# Altium footprint library std-th.PcbLib: 171 footprints (part 5 of 11)
Each footprint in its own frame and in the unit in brackets; x right, y up, seen from the top. Pads: shape width x height; smd on the part's side, far side on the other; paste and mask are expansions set on the pad; w line width, h text height; cw(c..) or ccw(c..) is an arc to the next point about the centre after c.
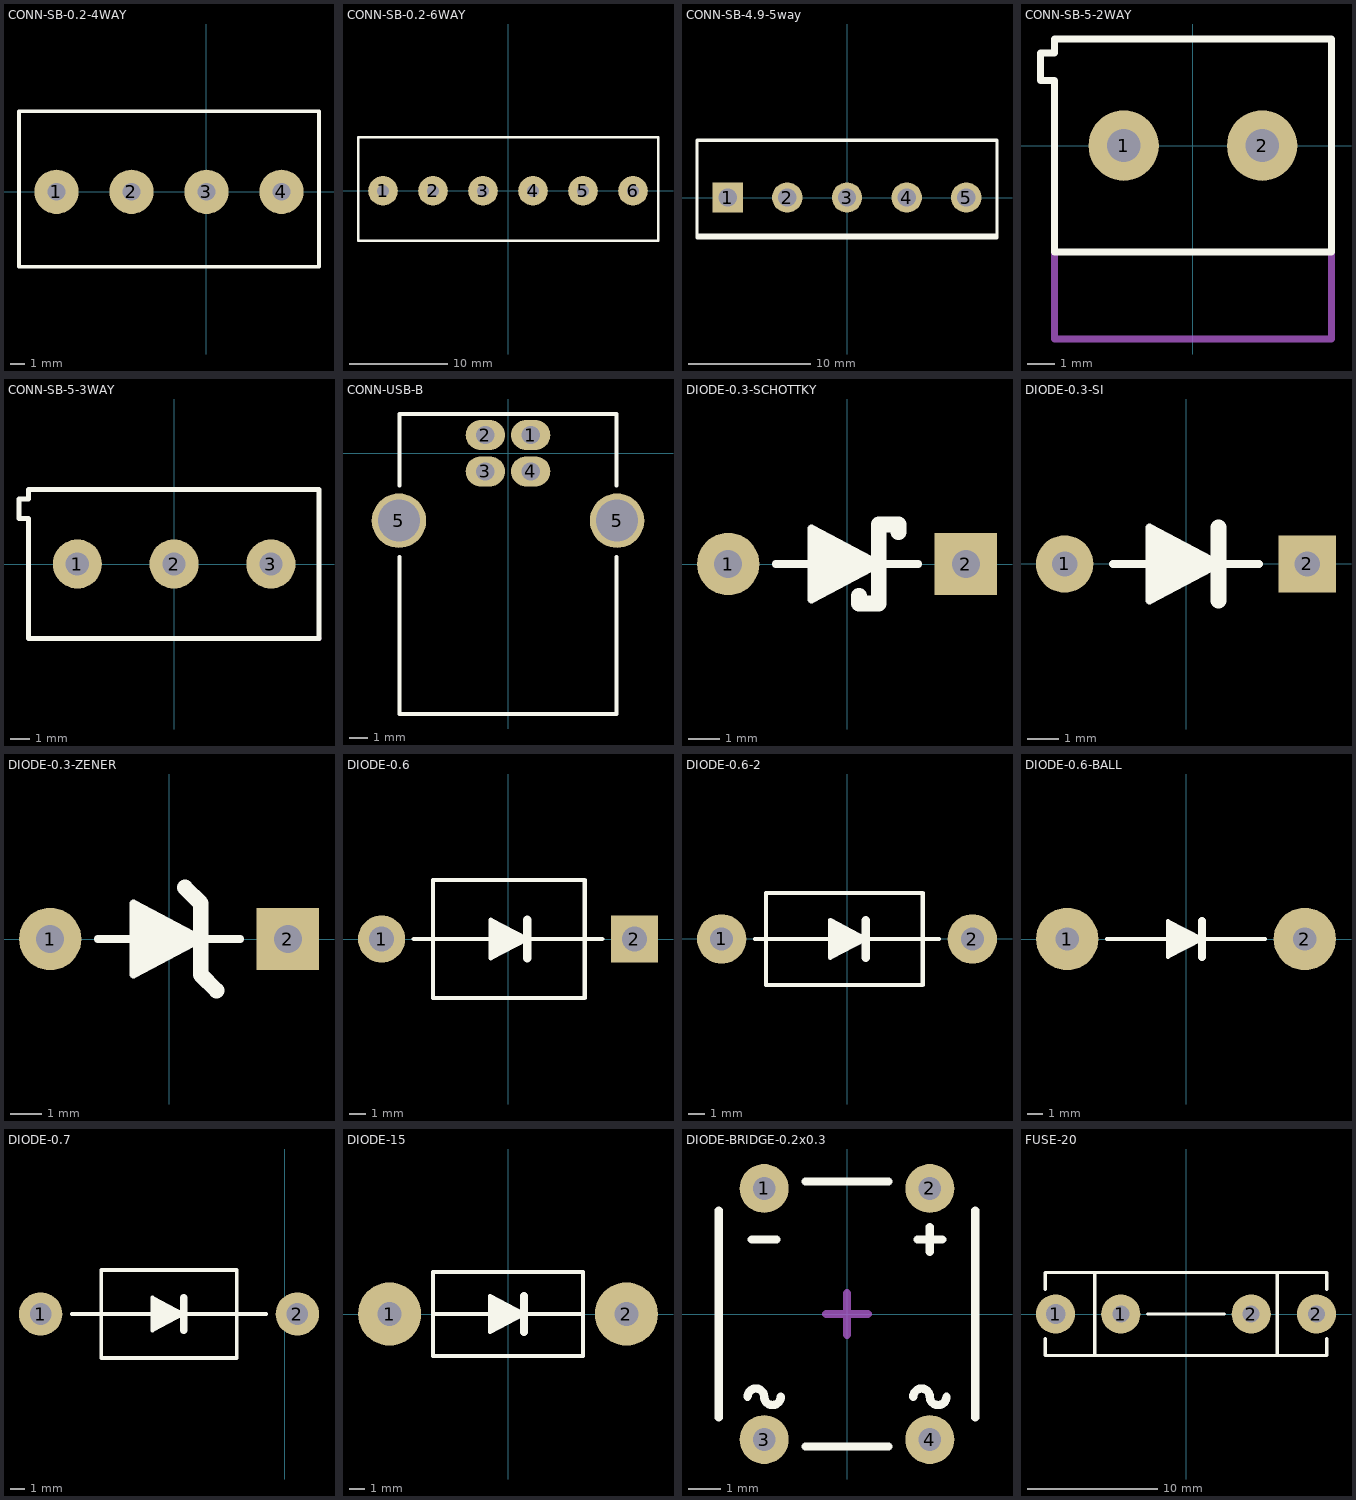
[diagram p4: the footprints below, top view; thin cyan lines are the x and y axes]

## CONN-SB-0.2-4WAY [mm] "Screw Terminal Block, 1 row 4 way, 5.08 mm pitch"
height 10
pads (4):
  round 3 hole 1.2: 1(-10.16,0) 2(-5.08,0) 3(0,0) 4(5.08,0)
Top Overlay:
  lines w0.254: -12.7,-5.08 -12.7,5.461 7.62,5.461 7.62,-5.08 -12.7,-5.08
3D body "User Library-klema-5mm-2pin.step": height 14, standoff -4, extent -12.667,-5.039 -2.667,5.461
3D body "User Library-klema-5mm-2pin.step": height 14, standoff -4, extent -2.507,-5.039 7.493,5.461

## CONN-SB-0.2-6WAY [mm] "Screw Terminal Block, 1 row 6 way, 5.08 mm pitch"
height 10
pads (6):
  round 3 hole 1.2: 1(-12.7,0) 2(-7.62,0) 3(-2.54,0) 4(2.54,0) 5(7.62,0) 6(12.7,0)
Top Overlay:
  lines w0.254: -15.24,-5.08 -15.24,5.461 15.24,5.461 15.24,-5.08 -15.24,-5.08
3D body "User Library-klema-5mm-3pin.step": height 14, standoff -4, extent -15.095,-5.026 -0.095,5.474
3D body "User Library-klema-5mm-3pin.step": height 14, standoff -4, extent 0.145,-5.026 15.145,5.474

## CONN-SB-4.9-5way [mm] "Screw block, 5 way, 4.90 mm pitch"
height 10
pads (5):
  rect 2.5x2.5 hole 1.5: 1(-9.8,0)
  round 2.5 hole 1.5: 2(-4.9,0) 3(0,0) 4(4.9,0) 5(9.8,0)
Top Overlay:
  lines w0.203: -12.319,-3.048 12.319,-3.048
  lines w0.254: -12.319,-3.302 -12.319,4.699 12.319,4.699 12.319,-3.302 -12.319,-3.302
3D body "HDR2-x.step": height 10, standoff -3.5, extent -12.366,-3.301 -2.366,4.699
3D body "HDR2-x.step": height 10, standoff -3.5, extent -7.54,-3.301 2.46,4.699
3D body "HDR2-x.step": height 10, standoff -3.5, extent 2.366,-3.301 12.366,4.699

## CONN-SB-5-2WAY [mm] "Screw Terminal Block, 1 row 2 way, 5 mm pitch"
height 10
pads (2):
  round 2.54 hole 1.2: 1(-2.5,0) 2(2.5,0)
Top Overlay:
  lines w0.254: 5,-3.85 5,3.85 -5,3.85 -5,3.35 -5.5,3.35 -5.5,2.35 -5,2.35 -5,-3.85 ; 5,-3.85 -5,-3.85 ; -5,-3.85 -5,-3.85
Mechanical 1:
  lines w0.254: -5,-3.85 -5,-6.985 ; -5,-6.985 5,-6.985 ; -5,-6.985 -5,-6.985 ; 5,-6.985 5,-3.81 ; 5,-6.985 5,-6.985 ; 5,-3.81 5,-3.81
3D body "User Library-CN_BT_1X2.step": height 10, standoff -2.28, extent -5.5,-3.85 5,3.85

## CONN-SB-5-3WAY [mm] "Screw Terminal Block, 1 row 3 way, 5 mm pitch"
height 10
pads (3):
  round 2.54 hole 1.2: 1(-5,0) 2(0,0) 3(5,0)
Top Overlay:
  lines w0.254: -8.014,2.35 -7.514,2.35 -7.514,-3.85 7.486,-3.85 7.486,-3.85 7.486,3.85 7.486,3.85 -7.514,3.85 -7.514,3.35 -8.014,3.35 -8.014,2.35
Mechanical 1:
  lines w0.254: 7.486,-3.85 7.486,-3.85
3D body "User Library-CN_BT_1X3.step": height 10.05, standoff -2.24, extent -8.014,-3.85 7.486,3.85

## CONN-USB-B [mm] "USB Connector, B Termination, Horizontal"
height 10
pads (6):
  oval 2.159x1.651 hole 1: 1(1.25,1) 2(-1.25,1) 3(-1.25,-1) 4(1.25,-1)
  round 3 hole 2.3: 5(-6,-3.71) 5(6,-3.71)
Top Overlay:
  lines w0.203: -5.969,-5.715 -5.969,-14.351 5.969,-14.351 5.969,-5.715 ; -5.969,-1.778 -5.969,2.159 5.969,2.159 5.969,-1.778
3D body "User Library-Samtec - USB-B-S-X-W-TH.STEP": height 11, standoff -3.64, extent -7.399,-14.026 7.397,2.474

## DIODE-0.3-SCHOTTKY [mm] "Axial Schottky Diode, Leads 0.3 inch spacing"
height 2.8
pads (2):
  round 2 hole 0.9: 1(-3.81,0)
  rect 2x2 hole 0.9: 2(3.81,0)
Top Overlay:
  region: -1.143,1.143 1.016,0 -1.143,-1.143
  lines w0.254: -2.286,0 2.286,0 ; -1.143,-1.143 -1.143,1.143 1.016,0 -1.143,-1.143
  lines w0.508: 0.381,-1.016 0.381,-1.27 1.016,-1.27 1.016,1.27 1.651,1.27 1.651,1.016
3D body "1N4007.step": height 3.06, standoff -1.27, extent -4.204,-1.333 4.204,1.334

## DIODE-0.3-SI [mm] "Axial Silicon Diode, Leads 0.3 inch spacing"
height 2.8
pads (2):
  round 1.8 hole 0.8: 1(-3.81,0)
  rect 1.8x1.8 hole 0.8: 2(3.81,0)
Top Overlay:
  region: -1.143,1.143 1.016,0 -1.143,-1.143
  lines w0.254: -2.286,0 2.286,0 ; -1.143,-1.143 1.016,0 -1.143,1.143 -1.143,-1.143
  lines w0.508: 1.016,-1.143 1.016,1.143
3D body "1N4007.step": height 3.06, standoff -1.27, extent -4.204,-1.333 4.204,1.334

## DIODE-0.3-ZENER [mm] "Axial Zener Diode, Leads 0.3 inch spacing"
height 2.8
pads (2):
  round 2 hole 0.9: 1(-3.81,0)
  rect 2x2 hole 0.9: 2(3.81,0)
Top Overlay:
  region: -1.143,1.143 1.016,0 -1.143,-1.143
  lines w0.254: -2.286,0 2.286,0 ; -1.143,-1.143 1.016,0 -1.143,1.143 -1.143,-1.143
  lines w0.508: 0.508,1.651 1.016,1.143 1.016,-1.143 1.524,-1.651
3D body "User Library-DO-35_300mils.STEP": height 2.46, standoff -2, extent -4.07,-0.96 4.07,0.96

## DIODE-0.6 [mil] "Diode, Axial Diode, Leads 0.6 inch spacing"
height 275.59
pads (2):
  round 110 hole 59.06: 1(-295.28,0)
  rect 110x110 hole 59.06: 2(295.28,0)
Top Overlay:
  region: -40,45 45,0 -40,-45
  lines w10: -220,0 -177.17,0 ; -182.01,0 192,-0.01 ; 177.17,0 220,0 ; -175,-137.52 179.33,-137.52 179.33,137.52 -175,137.52 -175,-137.52 ; -40,-45 -40,45 45,0 -40,-45
  lines w20: 45,-45 45,45
3D body "BYV28.step": height 226.38, standoff -59.06, extent -321.85,-88.59 321.85,88.58
3D body: height 274.5, standoff 0, extent -175,-137.52 179.33,137.52
3D body: height 275.09, standoff -0.2, extent 115,-137.92 154.37,137.92

## DIODE-0.6-2 [mm] "DO-201AD"
height 5
pads (2):
  round 3 hole 1.4: 1(-7.62,0) 2(7.62,0)
Top Overlay:
  region: -1.016,1.149 1.143,0.006 -1.016,-1.137
  lines w0.254: -5.588,0.006 -4.5,0.006 ; -5.461,0.006 -4.92,0 ; -4.623,0.006 4.877,0.006 ; 4.5,0.006 5.588,0.006 ; 4.61,0.006 5.334,0.006 ; -4.92,-2.8 4.61,-2.788 4.61,2.8 -4.92,2.8 -4.92,-2.8 ; -1.016,-1.137 1.143,0.006 -1.016,1.149 -1.016,-1.137
  lines w0.508: 1.143,-1.137 1.143,1.149
3D body "User Library-DO-201AD.STEP": height 7.6, standoff -4, extent -8.28,-2.8 8.28,2.8

## DIODE-0.6-BALL [mm] "Ball Power diode, 600 mil pitch"
pads (2):
  round 4 hole 1.5: 1(-7.62,0) 2(7.62,0)
Top Overlay:
  region: -1.143,1.143 1.016,0 -1.143,-1.143
  lines w0.254: -5.08,0 5.08,0 ; -1.143,-1.143 -1.143,1.143 1.016,0 -1.143,-1.143
  lines w0.508: 1.016,-1.143 1.016,1.143
3D body "User Library-BYV28-200.step": height 5.25, standoff -2, extent -8.175,-2.25 8.175,2.25

## DIODE-0.7 [mm] "Power diode, 700 mil pitch"
pads (2):
  round 3 hole 1.5: 1(-16.891,-22.86) 2(0.889,-22.86)
Top Overlay:
  region: -9.144,-21.717 -6.985,-22.86 -9.144,-24.003
  lines w0.254: -14.732,-22.86 -1.27,-22.86 ; -12.7,-25.908 -3.302,-25.908 -3.302,-19.812 -12.7,-19.812 -12.7,-25.908 ; -9.144,-24.003 -9.144,-21.717 -6.985,-22.86 -9.144,-24.003
  lines w0.508: -6.985,-24.003 -6.985,-21.717
3D body "User Library-DO-204AR-1.step": height 6.22, standoff -2, extent -17.526,-25.972 1.524,-19.747

## DIODE-15 [mm] "Power diode, 15 mm pitch"
pads (2):
  round 4 hole 1.5: 1(-7.5,0) 2(7.5,0)
Top Overlay:
  region: -1.143,1.143 1.016,0 -1.143,-1.143
  lines w0.254: -4.75,0 4.75,0 ; -4.75,-2.667 -4.75,2.667 4.75,2.667 4.75,-2.667 -4.75,-2.667 ; -1.143,-1.143 -1.143,1.143 1.016,0 -1.143,-1.143
  lines w0.508: 1.016,-1.143 1.016,1.143
3D body "User Library-BYW98.step": height 5.3, standoff -3.35, extent -8.15,-2.65 8.15,2.65

## DIODE-BRIDGE-0.2x0.3 [mm] "Bridge rectifier, 200 mil pitch, 300 mil row spacing"
height 8
pads (4):
  round 1.5 hole 0.7: 1(-2.54,3.85) 2(2.54,3.85) 3(-2.54,-3.85) 4(2.54,-3.85)
Top Overlay:
  lines w0.254: -3.937,-3.175 -3.937,3.175 ; -3.048,-2.54 cw(c-2.794,-2.54) -2.54,-2.54 ccw(c-2.286,-2.54) -2.032,-2.54 ; -2.921,2.286 -2.159,2.286 ; -1.27,-4.064 1.27,-4.064 ; -1.27,4.064 1.27,4.064 ; 2.032,-2.54 cw(c2.286,-2.54) 2.54,-2.54 ccw(c2.794,-2.54) 3.048,-2.54 ; 2.159,2.286 2.921,2.286 ; 2.54,1.905 2.54,2.667 ; 3.937,-3.175 3.937,3.175
Mechanical 15:
  lines w0.254: -0.635,0 0.635,0 ; 0,-0.635 0,0.635
3D body "DIP-4.step": height 3.8, standoff -2.7, extent -3.85,-3.993 3.85,3.99

## FUSE-20 [mm] "Fuse, through hole, 4 pin, 10 mm pitch"
height 8
pads (4):
  round 3 hole 1.5: 1(-10,0)
  round 3 hole 1.3: 1(-5,0) 2(5,0) 2(10,0)
Top Overlay:
  lines w0.254: -10.795,-1.905 -10.795,-3.175 10.795,-3.175 10.795,-1.905 ; -10.795,1.905 -10.795,3.175 10.795,3.175 10.795,1.905 ; -6.985,-3.175 -6.985,3.175 ; -2.921,0 2.921,0 ; 6.985,-3.175 6.985,3.175
3D body "SW3dPS-Full Fuse.STEP": height 9.59, standoff -3.31, extent -10.639,-3.142 10.639,3.048